# Altium footprint library agh_racing_2018.PcbLib: 174 footprints (part 7 of 11)
Each footprint in its own frame and in the unit in brackets; x right, y up, seen from the top. Pads: shape width x height; smd on the part's side, far side on the other; paste and mask are expansions set on the pad; w line width, h text height; cw(c..) or ccw(c..) is an arc to the next point about the centre after c.
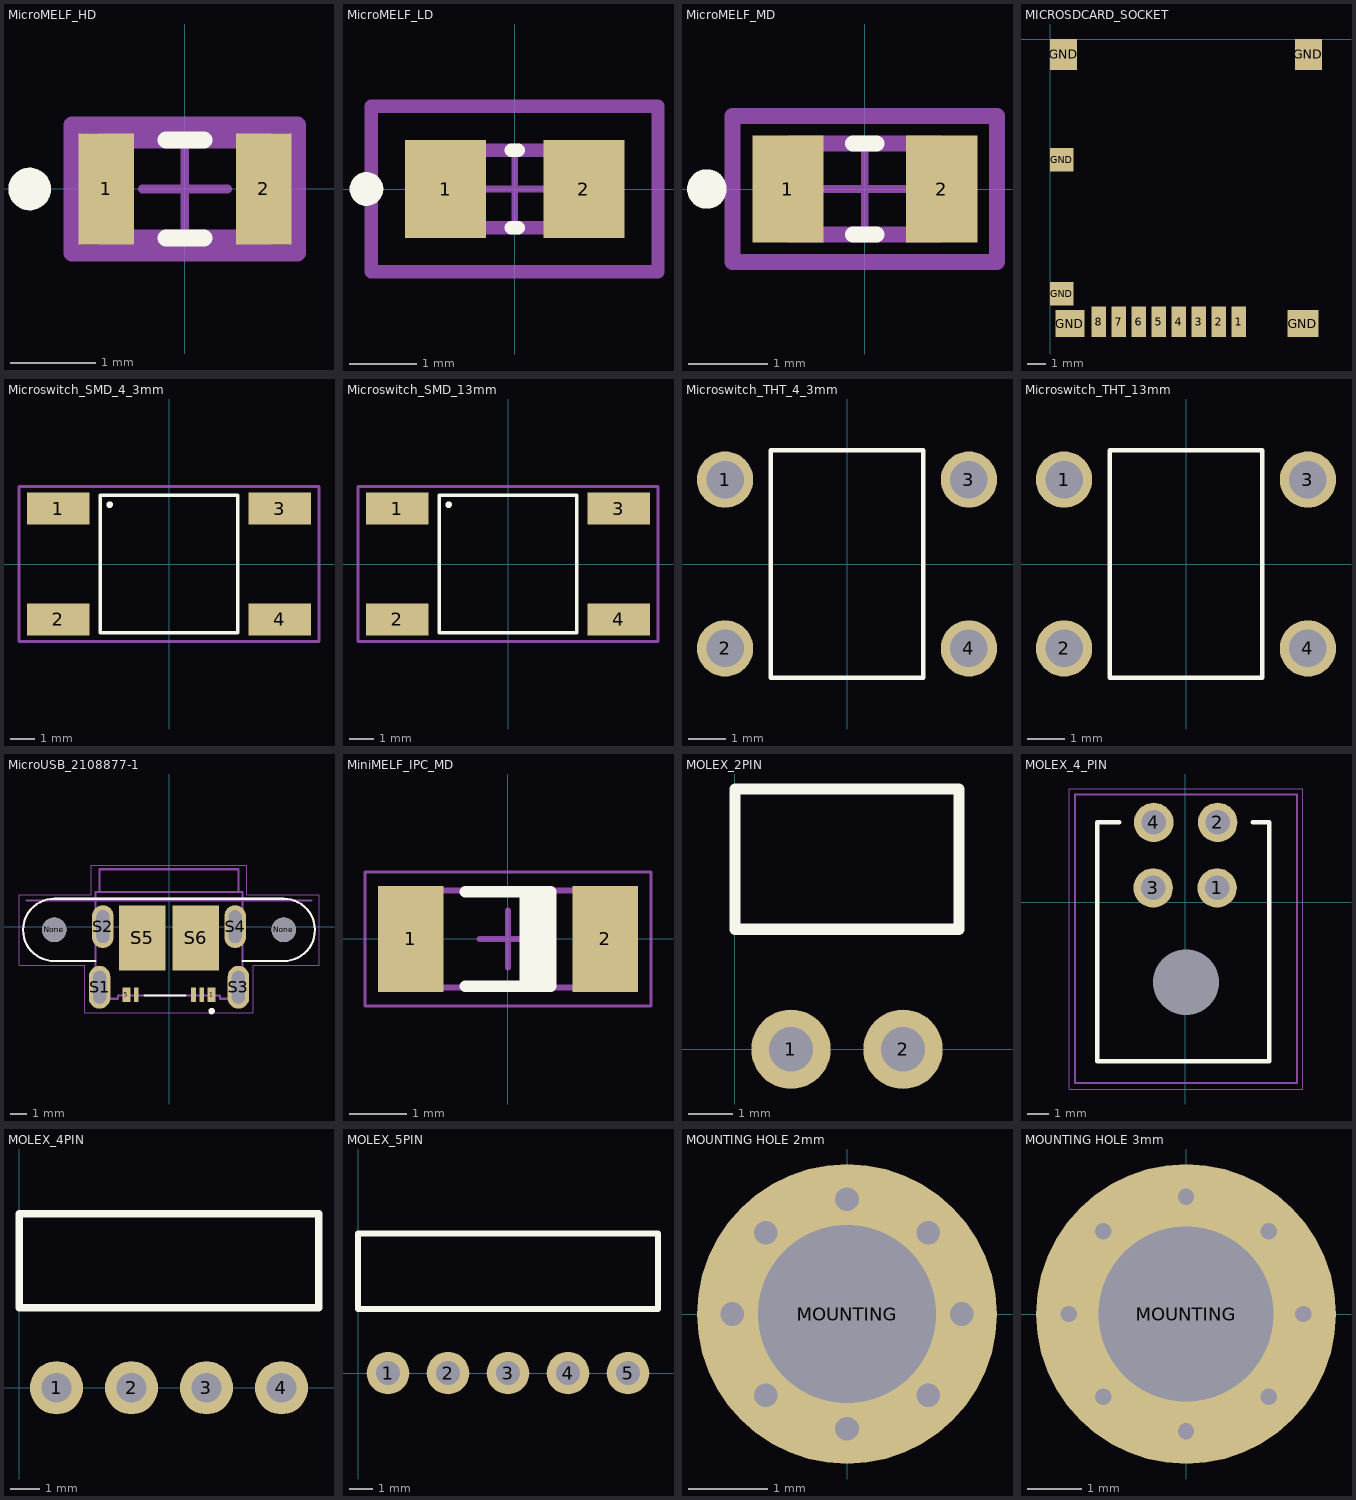
[diagram p6: the footprints below, top view; thin cyan lines are the x and y axes]

## MicroMELF_HD [mm]
pads (2):
  rect 0.65x1.3 smd paste+0 mask+0: 1(-0.925,0) 2(0.925,0)
Top Overlay:
  circle w0.25: c-1.825,0 r0.125
  lines w0.2: -0.225,-0.575 0.225,-0.575 ; -0.225,0.575 0.225,0.575
Courtyard Bottom:
  lines w0.2: -1.325,-0.75 -1.325,0.75 1.325,0.75 1.325,-0.75 -1.325,-0.75
  text ".Designator" at 0,0 h1
Mechanical 13:
  lines w0.2: -0.95,-0.575 -0.95,0.575 0.95,0.575 0.95,-0.575 -0.95,-0.575
Mechanical 15:
  lines w0.2: -1.325,-0.75 -1.325,0.75 1.325,0.75 1.325,-0.75 -1.325,-0.75
Mechanical 16:
  lines w0.1: -0.5,0 0.5,0 ; 0,-0.5 0,0.5
3D body "Diode_Vishay_BAS385-TR_eec.STEP": height 0.25, standoff 0, extent -1.325,-0.75 1.325,0.75

## MicroMELF_LD [mm]
pads (2):
  rect 1.2x1.45 smd paste+0 mask+0: 1(-1.025,0) 2(1.025,0)
Top Overlay:
  circle w0.25: c-2.2,0 r0.125
  lines w0.2: -0.05,-0.575 0.05,-0.575 ; -0.05,0.575 0.05,0.575
Courtyard Bottom:
  lines w0.2: -2.125,-1.225 -2.125,1.225 2.125,1.225 2.125,-1.225 -2.125,-1.225
  text ".Designator" at 0,0 h1
Mechanical 13:
  lines w0.2: -0.95,-0.575 -0.95,0.575 0.95,0.575 0.95,-0.575 -0.95,-0.575
Mechanical 15:
  lines w0.2: -2.125,-1.225 -2.125,1.225 2.125,1.225 2.125,-1.225 -2.125,-1.225
Mechanical 16:
  lines w0.1: -0.5,0 0.5,0 ; 0,-0.5 0,0.5
3D body "Diode_Vishay_BAS385-TR_eec.STEP": height 0.25, standoff 0, extent -2.125,-1.225 2.125,1.225

## MicroMELF_MD [mm]
pads (2):
  rect 0.9x1.35 smd paste+0 mask+0: 1(-0.975,0) 2(0.975,0)
Top Overlay:
  circle w0.25: c-2,0 r0.125
  lines w0.2: -0.15,-0.575 0.15,-0.575 ; -0.15,0.575 0.15,0.575
Courtyard Bottom:
  lines w0.2: -1.675,-0.925 1.675,-0.925 1.675,0.925 -1.675,0.925 -1.675,-0.925
  text ".Designator" at 0,0 h1
Mechanical 13:
  lines w0.2: -0.95,-0.575 0.95,-0.575 0.95,0.575 -0.95,0.575 -0.95,-0.575
Mechanical 15:
  lines w0.2: -1.675,-0.925 1.675,-0.925 1.675,0.925 -1.675,0.925 -1.675,-0.925
Mechanical 16:
  lines w0.1: -0.5,0 0.5,0 ; 0,-0.5 0,0.5
3D body "Diode_Vishay_BAS385-TR_eec.STEP": height 0.25, standoff 0, extent -1.675,-0.925 1.675,0.925

## MICROSDCARD_SOCKET [mm] "MOLEX 502774-0891 - 1.10mm Pitch microSD* Memory Card Connector, Reverse Mount Surface Mount, Push-Push Type"
height 1.2
pads (14):
  rect 0.8x1.68 smd mask+0.051: 1(10.4,-15.61) 2(9.3,-15.61) 3(8.2,-15.61) 4(7.1,-15.61) 5(6,-15.61) 6(4.9,-15.61) 7(3.8,-15.61) 8(2.7,-15.61)
  rect 1.29x1.3 smd mask+0.025: GND(0.645,-14.05)
  rect 1.29x1.3 smd mask+0.051: GND(0.645,-6.65)
  rect 1.5x1.7 smd mask+0.051: GND(0.75,-0.85) GND(14.25,-0.85)
  rect 1.6x1.5 smd mask+0.025: GND(1.09,-15.7)
  rect 1.7x1.5 smd mask+0.051: GND(13.95,-15.7)
3D body "5027740891.stp": height 1.83, standoff 0.03, extent 0.393,-16.19 14.693,-0.19

## Microswitch_SMD_4_3mm [mm] "6*6mm vertical type, SMD, height 4.3mm, NINIGI, TACTM-64N-F"
height 4.3
pads (4):
  rect 2.55x1.3 smd: 1(-4.5,2.25) 2(-4.5,-2.25) 3(4.5,2.25) 4(4.5,-2.25)
Top Overlay:
  circle w0.2: c-2.413,2.413 r0.036
  lines w0.127: -2.794,-2.794 2.794,-2.794 2.794,2.794 -2.794,2.794 -2.794,-2.794
Mechanical 15:
  lines w0.127: -6.1,-3.15 -6.1,-1.575 -6.1,1.575 -6.1,3.15 6.1,3.15 6.1,1.575 6.1,-1.575 6.1,-3.15 -6.1,-3.15
3D body "4301x20438x6.stp": height 4.29, standoff -0.01, extent -4.5,-3.1 4.5,3.1

## Microswitch_SMD_13mm [mm] "6*6mm vertical type, SMD, height 13.0mm, NINIGI, TACTM-613N-F"
height 13
pads (4):
  rect 2.55x1.3 smd: 1(-4.5,2.25) 2(-4.5,-2.25) 3(4.5,2.25) 4(4.5,-2.25)
Top Overlay:
  circle w0.2: c-2.413,2.413 r0.036
  lines w0.127: -2.794,-2.794 -2.794,2.794 2.794,2.794 2.794,-2.794 -2.794,-2.794
Mechanical 15:
  lines w0.127: -6.1,-3.15 6.1,-3.15 6.1,-1.575 6.1,1.575 6.1,3.15 -6.1,3.15 -6.1,1.575 -6.1,-1.575 -6.1,-3.15
3D body "4301x21308x6.stp": height 12.99, standoff -0.01, extent -4.5,-3.1 4.5,3.1

## Microswitch_THT_4_3mm [mm] "6*6mm vertical type, THT, height 4.3mm, NINIGI, TACT-64K-F"
height 4.3
pads (4):
  round 1.5 hole 1: 1(-3.25,2.25) 2(-3.25,-2.25) 3(3.25,2.25) 4(3.25,-2.25)
Top Overlay:
  lines w0.127: -2.032,-3.036 2.032,-3.036 2.032,3.036 -2.032,3.036 -2.032,-3.036
3D body "4301x60437x6.stp": height 4.31, standoff -3.49, extent -3.947,-3.1 3.947,3.1

## Microswitch_THT_13mm [mm] "6*6mm vertical type, THT, height 13mm, NINIGI, TACT-613N-F"
height 13
pads (4):
  round 1.5 hole 1: 1(-3.25,2.25) 2(-3.25,-2.25) 3(3.25,2.25) 4(3.25,-2.25)
Top Overlay:
  lines w0.127: -2.032,-3.036 2.032,-3.036 2.032,3.036 -2.032,3.036 -2.032,-3.036
3D body "4301x61307x6.stp": height 13.01, standoff -3.49, extent -3.947,-3.1 3.947,3.1

## MicroUSB_2108877-1 [mm]
pads (13):
  rect 0.5x0.9 smd: 1(2.6,-4.15) 5(-2.6,-4.15)
  rect 0.3x0.9 smd: 2(2,-4.15) 3(1.5,-4.15) 4(-2,-4.15)
  round 1.5 hole 1.5 unplated: None(-7,-0.2) None(7,-0.2)
  oval 1.308x2.616 hole 0.8 slot 2 at 90 deg: S1(-4.235,-3.7) S2(-4.035,0) S3(4.235,-3.7) S4(4.035,0)
  rect 2.85x3.98 smd: S5(-1.625,-0.69) S6(1.625,-0.69)
Top Overlay:
  circle w0.2: c2.6,-5.15 r0.1
  lines w0.127: -4.5,-2.1 -7,-2.1 cw(c-7,-0.2) -8.9,-0.2 cw(c-7,-0.2) -7,1.7 -4.485,1.7 4.485,1.7 7,1.7 cw(c7,-0.2) 8.9,-0.2 cw(c7,-0.2) 7,-2.1 4.5,-2.1 ; -1.5,-4.2 1,-4.2
Mechanical 1:
  lines w0: -4.635,-4.2 ccw(c-4.235,-4.2) -4.235,-4.6 ccw(c-4.235,-4.2) -3.835,-4.2 -3.835,-3.2 ccw(c-4.235,-3.2) -4.235,-2.8 ccw(c-4.235,-3.2) -4.635,-3.2 -4.635,-4.2 ; -4.435,-0.5 ccw(c-4.035,-0.5) -4.035,-0.9 ccw(c-4.035,-0.5) -3.635,-0.5 -3.635,0.5 ccw(c-4.035,0.5) -4.035,0.9 ccw(c-4.035,0.5) -4.435,0.5 -4.435,-0.5 ; 3.635,-0.5 ccw(c4.035,-0.5) 4.035,-0.9 ccw(c4.035,-0.5) 4.435,-0.5 4.435,0.5 ccw(c4.035,0.5) 4.035,0.9 ccw(c4.035,0.5) 3.635,0.5 3.635,-0.5 ; 3.835,-4.2 ccw(c4.235,-4.2) 4.235,-4.6 ccw(c4.235,-4.2) 4.635,-4.2 4.635,-3.2 ccw(c4.235,-3.2) 4.235,-2.8 ccw(c4.235,-3.2) 3.835,-3.2 3.835,-4.2
Courtyard Top:
  lines w0.127: -8.9,-0.2 cw(c-7,-0.2) -7,1.7 ; -8.9,-0.2 ccw(c-7,-0.2) -7,-2.1 ; -8.9,-0.2 cw(c-7,-0.2) -7,1.7 ; -8.9,-0.2 ccw(c-7,-0.2) -7,-2.1 ; -7,-2.1 -4.485,-2.1 ; -7,-2.1 -4.485,-2.1 ; -7,1.7 -4.485,1.7 ; -7,1.7 -4.485,1.7 ; -4.485,-4.4 -3.1,-4.4 ; -4.485,-4.4 -4.485,-2.1 ; -4.485,-4.4 -3.1,-4.4 ; -4.485,-4.4 -4.485,-2.1 ; -4.485,-2.1 -4.485,1.715 ; -4.485,-2.1 -4.485,1.715 ; -4.485,1.7 cw(c-4.477,1.707) -4.485,1.715 ; -4.485,1.7 cw(c-4.477,1.707) -4.485,1.715 ; -4.485,1.7 4.485,1.7 ; -4.485,1.7 4.485,1.7 ; -4.485,1.715 -4.485,2.1 ; -4.485,1.715 -4.485,2.1 ; -4.485,2.1 -4.235,2.1 ; -4.485,2.1 -4.235,2.1 ; -4.235,2.1 4.235,2.1 ; -4.235,2.1 -4.235,3.5 ; -4.235,2.1 4.235,2.1 ; -4.235,2.1 -4.235,3.5 ; -4.235,3.5 4.235,3.5 ; -4.235,3.5 4.235,3.5 ; -3.1,-4.4 -3.1,-4.2 ; -3.1,-4.4 -3.1,-4.2 ; -3.1,-4.2 3.1,-4.2 ; -3.1,-4.2 3.1,-4.2 ; 3.1,-4.4 3.1,-4.2 ; 3.1,-4.4 4.485,-4.4 ; 3.1,-4.4 3.1,-4.2 ; 3.1,-4.4 4.485,-4.4 ; 4.235,2.1 4.485,2.1 ; 4.235,2.1 4.235,3.5 ; 4.235,2.1 4.485,2.1 ; 4.235,2.1 4.235,3.5 ; 4.485,-4.4 4.485,-2.1 ; 4.485,-4.4 4.485,-2.1 ; 4.485,-2.1 4.485,1.715 ; 4.485,-2.1 7,-2.1 ; 4.485,-2.1 4.485,1.715 ; 4.485,-2.1 7,-2.1 ; 4.485,1.7 ccw(c4.477,1.707) 4.485,1.715 ; 4.485,1.7 ccw(c4.477,1.707) 4.485,1.715 ; 4.485,1.7 7,1.7 ; 4.485,1.7 7,1.7 ; 4.485,1.715 4.485,2.1 ; 4.485,1.715 4.485,2.1 ; 7,-2.1 ccw(c7,-0.2) 8.9,-0.2 ; 7,-2.1 ccw(c7,-0.2) 8.9,-0.2 ; 7,1.7 cw(c7,-0.2) 8.9,-0.2 ; 7,1.7 cw(c7,-0.2) 8.9,-0.2 ; -8.7,1.6 8.7,1.6 -8.7,1.6
Mechanical 16:
  lines w0.05: -9.15,-2.35 -9.15,1.95 -4.735,1.95 -4.735,3.75 4.735,3.75 4.735,1.95 9.15,1.95 9.15,-2.35 5.14,-2.35 5.14,-5.26 -5.14,-5.26 -5.14,-2.35 -9.15,-2.35
3D body "c-2108877-1-b-3d.stp": height 3.39, standoff -0.64, extent -8.9,-4.4 8.9,3.5

## MiniMELF_IPC_MD [mm] "MELF Diode, 2-Leads, Body 3.50x1.65mm, IPC Medium Density"
height 1.7
pads (2):
  rect 1.15x1.85 smd: 1(-1.7,0) 2(1.7,0)
Top Overlay:
  rectangle: 0.2,-0.825 0.75,0.825
  lines w0.2: -0.75,-0.825 0.75,-0.825 0.75,0.825 -0.75,0.825
Mechanical 13:
  lines w0.1: -1.85,-0.85 1.85,-0.85 1.85,0.85 -1.85,0.85 -1.85,-0.85
Mechanical 15:
  lines w0.05: -2.5,-1.175 2.5,-1.175 2.5,1.175 -2.5,1.175 -2.5,-1.175
  lines w0.1: -0.5,0 0.5,0 ; 0,-0.5 0,0.5
3D body "MiniMELF_IPC_MD2.step": height 1.65, standoff 0.01, extent -1.75,-0.823 1.75,0.823

## MOLEX_2PIN [mm] "MOLEX Connector, 2-pin"
pads (2):
  round 1.8 hole 1: 1(1.27,0) 2(3.81,0)
Top Overlay:
  lines w0.254: 0,2.72 0,5.9 5.08,5.9 5.08,2.72 0,2.72
3D body "022057028.stp": height 5.84, standoff -3.8, extent 0,-0.318 5.08,14.42

## MOLEX_4_PIN [mm]
height 7.75
pads (5):
  round 1.8 hole 1.12: 1(1.45,0.66) 2(1.475,3.66) 3(-1.475,0.66) 4(-1.45,3.66)
  round 0 hole 3: ""(0.025,-3.66)
Top Overlay:
  lines w0.2: -3.023,3.66 -4.039,3.66 -4.039,-7.262 3.835,-7.262 3.835,3.66 3.073,3.66
Mechanical 1:
  lines w0.1: -5.05,-8.26 5.1,-8.26 5.1,4.93 -5.05,4.93 -5.05,-8.26
Mechanical 15:
  lines w0.05: -5.309,-8.532 -5.309,5.184 5.359,5.184 5.359,-8.532 -5.309,-8.532
3D body "430450400.stp": height 8.77, standoff -3.17, extent -5.05,-8.26 5.1,3.98

## MOLEX_4PIN [mm] "MOLEX Connector, 4-pin"
pads (4):
  round 1.8 hole 1: 1(1.27,0) 2(3.81,0) 3(6.35,0) 4(8.89,0)
Top Overlay:
  lines w0.254: 0,2.72 10.16,2.72 10.16,5.9 0,5.9 0,2.72
3D body "022057048.stp": height 5.85, standoff -3.79, extent 0,-0.317 10.16,14.42

## MOLEX_5PIN [mm] "MOLEX Connector, 5-pin"
pads (5):
  round 1.8 hole 1: 1(1.27,0) 2(3.81,0) 3(6.35,0) 4(8.89,0) 5(11.43,0)
Top Overlay:
  lines w0.254: 0,2.72 12.7,2.72 12.7,5.9 0,5.9 0,2.72
3D body "022057058.stp": height 5.85, standoff -3.79, extent 0,-0.317 12.7,14.42

## MOUNTING HOLE 2mm [mm]
pads (1):
  round 3.8 hole 2.25 paste+0 mask+0: MOUNTING(0,0)
via -1.455,0 diameter 0.711 hole 0.3
via -1.029,-1.029 diameter 0.711 hole 0.3
via 0,-1.455 diameter 0.711 hole 0.3
via 1.029,-1.029 diameter 0.711 hole 0.3
via 1.455,0 diameter 0.711 hole 0.3
via 1.029,1.029 diameter 0.711 hole 0.3
via 0,1.455 diameter 0.711 hole 0.3
via -1.029,1.029 diameter 0.711 hole 0.3

## MOUNTING HOLE 3mm [mm]
pads (1):
  round 5.5 hole 3.2 paste+0 mask+0: MOUNTING(0,0)
via -2.15,0 diameter 0.711 hole 0.3
via -1.52,1.52 diameter 0.711 hole 0.3
via 1.52,1.52 diameter 0.711 hole 0.3
via 2.15,0 diameter 0.711 hole 0.3
via 1.52,-1.52 diameter 0.711 hole 0.3
via 0,-2.15 diameter 0.711 hole 0.3
via -1.52,-1.52 diameter 0.711 hole 0.3
via 0,2.15 diameter 0.711 hole 0.3